# Altium footprint library 显示器件.PcbLib: 14 footprints
Each footprint in its own frame and in the unit in brackets; x right, y up, seen from the top. Pads: shape width x height; smd on the part's side, far side on the other; paste and mask are expansions set on the pad; w line width, h text height; cw(c..) or ccw(c..) is an arc to the next point about the centre after c.
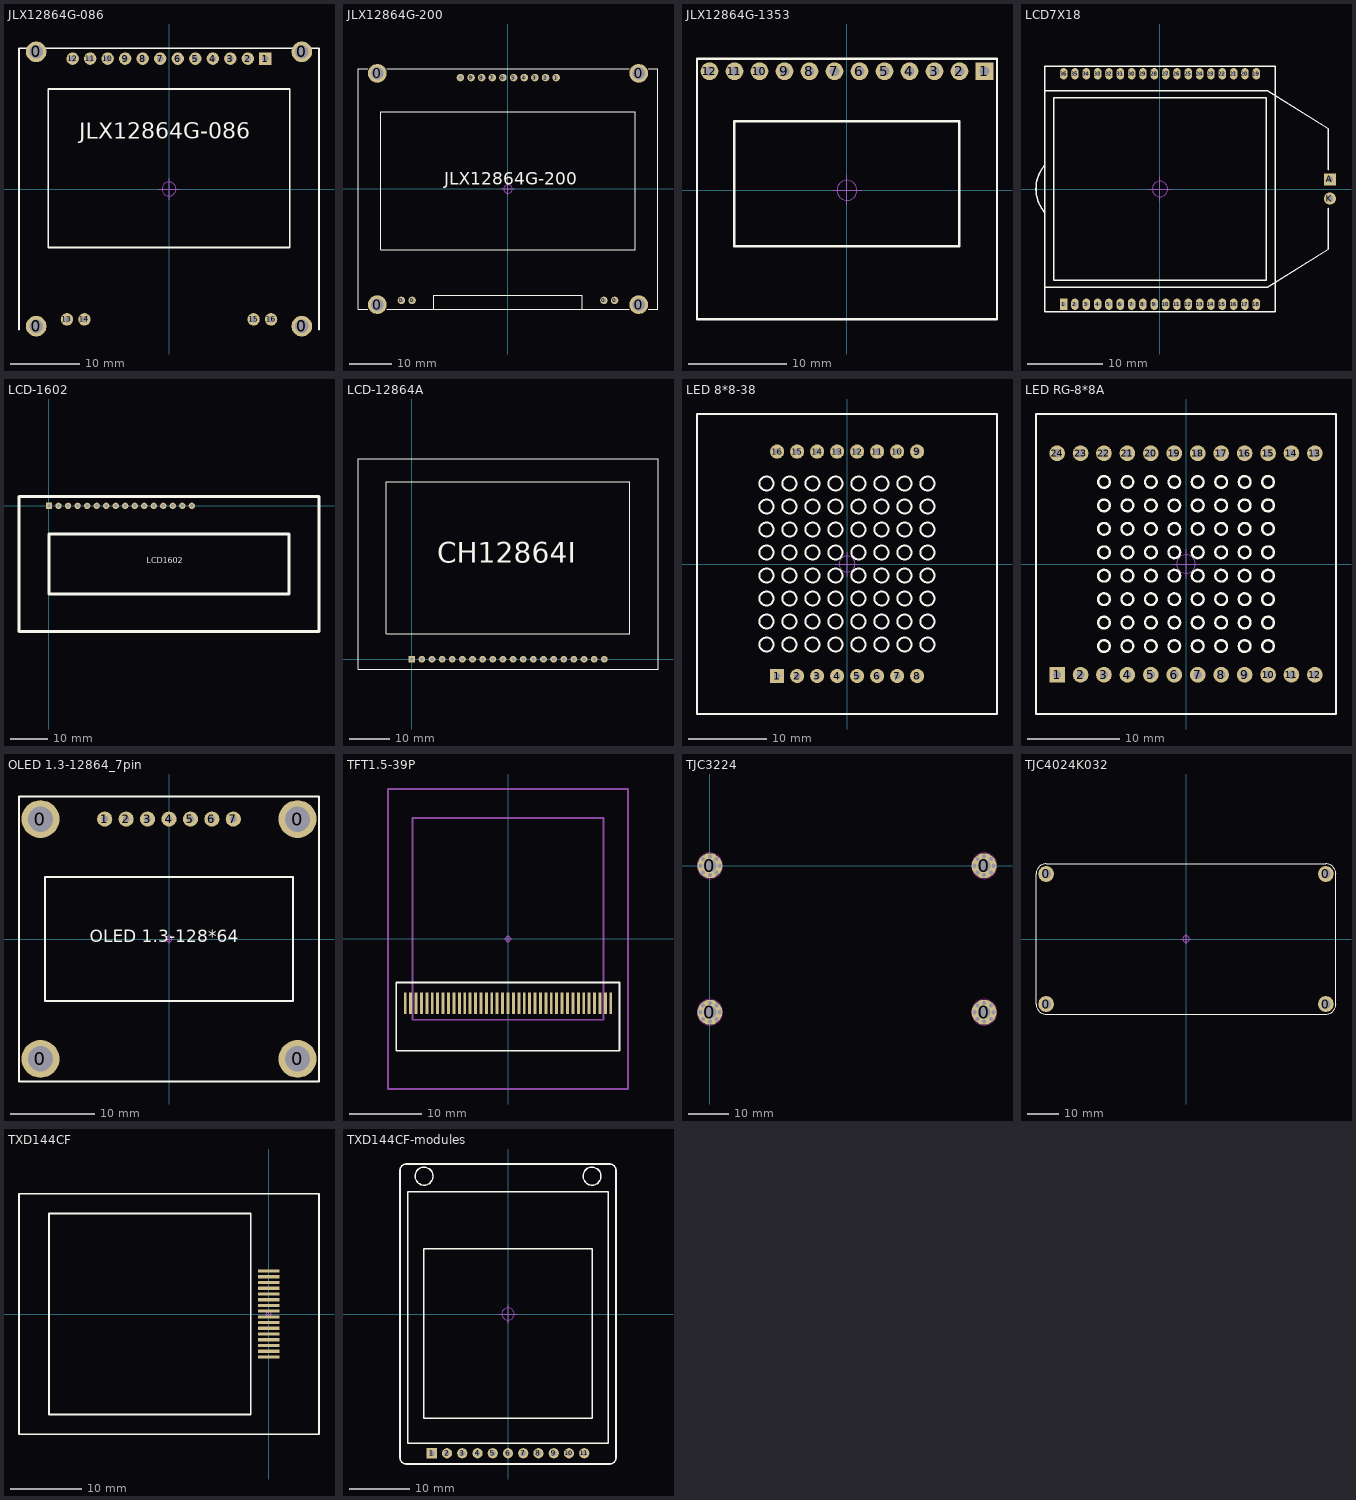
[diagram p0: the footprints below, top view; thin cyan lines are the x and y axes]

## JLX12864G-086 [mm] "长：43.5mm，宽：40.8mm，高：4.5mm"
pads (20):
  round 3 hole 2: 0(-19.25,-19.9) 0(-19.25,19.9) 0(19.25,-19.9) 0(19.25,19.9)
  rect 1.8x1.8 hole 0.9: 1(13.97,18.9)
  round 1.8 hole 0.9: 2(11.43,18.9) 3(8.89,18.9) 4(6.35,18.9) 5(3.81,18.9) 6(1.27,18.9) 7(-1.27,18.9) 8(-3.81,18.9) 9(-6.35,18.9) 10(-8.89,18.9) 11(-11.43,18.9) 12(-13.97,18.9) 13(-14.8,-18.9) 14(-12.26,-18.9) 15(12.26,-18.9) 16(14.8,-18.9)
Top Overlay:
  lines w0.254: -21.75,-20.4 -21.75,20.4 21.75,20.4 21.75,-20.4 ; -17.5,-8.5 17.5,-8.5 17.5,14.5 -17.5,14.5 -17.5,-8.5
  text "JLX12864G-086" at -13,6.5 h4
Mechanical 15:
  circle w0.1: c0,0 r1.016
  lines w0.1: -1.524,0 1.524,0 ; 0,-1.524 0,1.524
3D body: height 7.09, standoff -5.88, extent -21.75,-20.401 21.75,20.401

## JLX12864G-200 [mm] "长：71.4mm，宽：57.2mm，高：9.4mm"
pads (18):
  round 4.5 hole 3: 0(-31.2,-27.6) 0(-31.2,27.6) 0(31.2,-27.6) 0(31.2,27.6)
  round 1.8 hole 0.9: 0(-25.44,-26.6) 0(-22.9,-26.6) 0(22.9,-26.6) 0(25.44,-26.6) 1(11.5,26.6) 2(8.96,26.6) 3(6.42,26.6) 4(3.88,26.6) 5(1.34,26.6) 6(-1.2,26.6) 7(-3.74,26.6) 8(-6.28,26.6) 9(-8.82,26.6) 10(-11.36,26.6)
Top Overlay:
  lines w0.2: -33.528,-28.702 -35.814,-28.702 -35.814,28.702 -33.528,28.702 ; -28.956,-28.702 28.956,-28.702 ; -28.956,28.702 28.956,28.702 ; -17.78,-28.702 -17.78,-25.4 17.78,-25.4 17.78,-28.702 ; 33.528,-28.702 35.814,-28.702 35.814,28.702 33.528,28.702 ; -30.39,-14.53 30.39,-14.53 30.39,18.43 -30.39,18.43 -30.39,-14.53
  text "JLX12864G-200" at -15.24,0 h5.08
Mechanical 15:
  circle w0.1: c0,0 r1.016
  lines w0.1: -1.524,0 1.524,0 ; 0,-1.524 0,1.524
3D body: height 9.4, standoff -6.02, extent -35.7,-28.6 35.7,28.6

## JLX12864G-1353 [mm] "29.9mm*26.17mm"
pads (12):
  rect 1.8x1.8 hole 1: 1(13.97,12.1)
  round 1.8 hole 1: 2(11.43,12.1) 3(8.89,12.1) 4(6.35,12.1) 5(3.81,12.1) 6(1.27,12.1) 7(-1.27,12.1) 8(-3.81,12.1) 9(-6.35,12.1) 10(-8.89,12.1) 11(-11.43,12.1) 12(-13.97,12.1)
Top Overlay:
  lines w0.254: -15.24,-13.1 15.24,-13.1 15.24,13.37 ; -15.24,-13.1 -15.24,-13.1 ; -15.24,-13.1 -15.24,13.37 15.24,13.37 ; 15.24,13.37 15.24,13.37 ; -11.43,-5.68 -11.43,7.02 11.43,7.02 11.43,-5.68 -11.43,-5.68
Mechanical 15:
  circle w0.1: c0,0 r1.016
  lines w0.1: -1.524,0 1.524,0 ; 0,-1.524 0,1.524
3D body: height 7.1, standoff -5.97, extent -15.24,-13.1 15.24,13.37

## LCD7X18 [mm] "定制型带背光液晶屏"
pads (38):
  rect 1x1.5 hole 0.6: 1(-12.75,-15.25)
  oval 1x1.5 hole 0.6: 2(-11.25,-15.25) 3(-9.75,-15.25) 4(-8.25,-15.25) 5(-6.75,-15.25) 6(-5.25,-15.25) 7(-3.75,-15.25) 8(-2.25,-15.25) 9(-0.75,-15.25) 10(0.75,-15.25) 11(2.25,-15.25) 12(3.75,-15.25) 13(5.25,-15.25) 14(6.75,-15.25) 15(8.25,-15.25) 16(9.75,-15.25) 17(11.25,-15.25) 18(12.75,-15.25) 19(12.75,15.25) 20(11.25,15.25) 21(9.75,15.25) 22(8.25,15.25) 23(6.75,15.25) 24(5.25,15.25) 25(3.75,15.25) 26(2.25,15.25) 27(0.75,15.25) 28(-0.75,15.25) 29(-2.25,15.25) 30(-3.75,15.25) 31(-5.25,15.25) 32(-6.75,15.25) 33(-8.25,15.25) 34(-9.75,15.25) 35(-11.25,15.25) 36(-12.75,15.25)
  rect 1.6x1.6 hole 0.8: A(22.5,1.27)
  round 1.6 hole 0.8: K(22.5,-1.27)
Top Overlay:
  lines w0.203: -15.25,-13 14.25,-13 22.25,-8 22.25,-2.54 ; -15.25,13 14.25,13 22.25,8 22.25,2.54 ; -15.25,3.137 ccw(c-11.574,0) -15.231,-3.159 ; -15.25,-16.25 -15.25,16.25 15.25,16.25 15.25,-16.25 -15.25,-16.25 ; -14.05,-12.05 -14.05,12.05 14.05,12.05 14.05,-12.05 -14.05,-12.05
Mechanical 15:
  circle w0.1: c0,0 r1.016
  lines w0.1: -1.524,0 1.524,0 ; 0,-1.524 0,1.524

## LCD-1602 [mm] "LCD module 16*2 char"
pads (16):
  rect 1.7x1.7 hole 0.9: 1(0,0)
  round 1.7 hole 0.9: 2(2.54,0) 3(5.08,0) 4(7.62,0) 5(10.16,0) 6(12.7,0) 7(15.24,0) 8(17.78,0) 9(20.32,0) 10(22.86,0) 11(25.4,0) 12(27.94,0) 13(30.48,0) 14(33.02,0) 15(35.56,0) 16(38.1,0)
Top Overlay:
  lines w0.762: -8,-33.5 72,-33.5 72,2.5 -8,2.5 -8,-33.5 ; 0,-23.5 64,-23.5 64,-7.5 0,-7.5 0,-23.5
  text "LCD1602" at 26.036,-15.28 h1.52
3D body: height 9, standoff -3.7, extent -8.147,-33.11 71.853,1.89

## LCD-12864A [mm] "CH12864I 显示屏，规格：75*52.7mm"
pads (20):
  rect 1.7x1.7 hole 0.9: 1(0,0)
  round 1.7 hole 0.9: 2(2.54,0) 3(5.08,0) 4(7.62,0) 5(10.16,0) 6(12.7,0) 7(15.24,0) 8(17.78,0) 9(20.32,0) 10(22.86,0) 11(25.4,0) 12(27.94,0) 13(30.48,0) 14(33.02,0) 15(35.56,0) 16(38.1,0) 17(40.64,0) 18(43.18,0) 19(45.72,0) 20(48.26,0)
Top Overlay:
  lines w0.254: -13.462,-2.54 61.722,-2.54 61.722,50.292 -13.462,50.292 -13.462,-2.54 ; -6.35,6.35 54.61,6.35 54.61,44.45 -6.35,44.45 -6.35,6.35
  text "CH12864I" at 6.35,24.13 h5.08
3D body: height 8.54, standoff -3, extent -1.27,-1.27 49.53,1.27
3D body: height 7.93, standoff -0.57, extent -13.345,-2.489 61.655,50.211

## LED 8*8-38 [mm] "单色8*8点阵，38mm*38mm"
pads (16):
  rect 1.8x1.8 hole 0.8: 1(-8.874,-14.224)
  round 1.8 hole 0.8: 2(-6.334,-14.224) 3(-3.794,-14.224) 4(-1.254,-14.224) 5(1.286,-14.224) 6(3.826,-14.224) 7(6.366,-14.224) 8(8.906,-14.224) 9(8.906,14.276) 10(6.366,14.276) 11(3.826,14.276) 12(1.286,14.276) 13(-1.254,14.276) 14(-3.794,14.276) 15(-6.334,14.276) 16(-8.874,14.276)
Top Overlay:
  circle w0.254: c1.46,1.46 r0.889
  circle w0.254: c-1.46,1.46 r0.889
  circle w0.254: c-1.46,-1.46 r0.889
  circle w0.254: c1.46,-1.46 r0.889
  circle w0.254: c1.46,4.381 r0.889
  circle w0.254: c1.46,7.302 r0.889
  circle w0.254: c1.46,10.223 r0.889
  circle w0.254: c1.46,-4.381 r0.889
  circle w0.254: c1.46,-7.302 r0.889
  circle w0.254: c1.46,-10.223 r0.889
  circle w0.254: c4.381,-1.46 r0.889
  circle w0.254: c7.302,-1.46 r0.889
  circle w0.254: c10.223,-1.46 r0.889
  circle w0.254: c-4.381,-1.46 r0.889
  circle w0.254: c-7.302,-1.46 r0.889
  circle w0.254: c-10.223,-1.46 r0.889
  circle w0.254: c-10.223,10.223 r0.889
  circle w0.254: c-7.302,10.223 r0.889
  circle w0.254: c-4.381,10.223 r0.889
  circle w0.254: c-1.46,10.223 r0.889
  circle w0.254: c-1.46,7.302 r0.889
  circle w0.254: c-4.381,7.302 r0.889
  circle w0.254: c-7.302,7.302 r0.889
  circle w0.254: c-10.223,7.302 r0.889
  circle w0.254: c-10.223,4.381 r0.889
  circle w0.254: c-7.302,4.381 r0.889
  circle w0.254: c-4.381,4.381 r0.889
  circle w0.254: c-1.46,4.381 r0.889
  circle w0.254: c-4.381,1.46 r0.889
  circle w0.254: c-7.302,1.46 r0.889
  circle w0.254: c-10.223,1.46 r0.889
  circle w0.254: c-10.223,-4.381 r0.889
  circle w0.254: c-10.223,-7.302 r0.889
  circle w0.254: c-10.223,-10.223 r0.889
  circle w0.254: c-7.302,-10.223 r0.889
  circle w0.254: c-7.302,-7.302 r0.889
  circle w0.254: c-7.302,-4.381 r0.889
  circle w0.254: c-4.381,-4.381 r0.889
  circle w0.254: c-4.381,-7.302 r0.889
  circle w0.254: c-4.381,-10.223 r0.889
  circle w0.254: c-1.46,-10.223 r0.889
  circle w0.254: c-1.46,-7.302 r0.889
  circle w0.254: c-1.46,-4.381 r0.889
  circle w0.254: c4.381,10.223 r0.889
  circle w0.254: c7.302,10.223 r0.889
  circle w0.254: c10.223,10.223 r0.889
  circle w0.254: c10.223,1.46 r0.889
  circle w0.254: c10.223,4.381 r0.889
  circle w0.254: c10.223,7.302 r0.889
  circle w0.254: c7.302,7.302 r0.889
  circle w0.254: c7.302,4.381 r0.889
  circle w0.254: c7.302,1.46 r0.889
  circle w0.254: c4.381,1.46 r0.889
  circle w0.254: c4.381,4.381 r0.889
  circle w0.254: c4.381,7.302 r0.889
  circle w0.254: c4.381,-4.381 r0.889
  circle w0.254: c4.381,-7.302 r0.889
  circle w0.254: c4.381,-10.223 r0.889
  circle w0.254: c7.302,-10.223 r0.889
  circle w0.254: c7.302,-7.302 r0.889
  circle w0.254: c7.302,-4.381 r0.889
  circle w0.254: c10.223,-4.381 r0.889
  circle w0.254: c10.223,-7.302 r0.889
  circle w0.254: c10.223,-10.223 r0.889
  lines w0.254: -19.05,-19.05 -19.05,19.05 19.05,19.05 19.05,-19.05 -19.05,-19.05
Mechanical 15:
  circle w0.1: c0,0 r1.016
  lines w0.1: -1.524,0 1.524,0 ; 0,-1.524 0,1.524
3D body: height 7.25, standoff -3.45, extent -19,-19 19,19

## LED RG-8*8A [mm] "双色8*8点阵,32*32mm"
pads (24):
  rect 1.7x1.7 hole 0.9: 1(-13.97,-12)
  round 1.7 hole 0.9: 2(-11.43,-12) 3(-8.89,-12) 4(-6.35,-12) 5(-3.81,-12) 6(-1.27,-12) 7(1.27,-12) 8(3.81,-12) 9(6.35,-12) 10(8.89,-12) 11(11.43,-12) 12(13.97,-12) 13(13.97,12) 14(11.43,12) 15(8.89,12) 16(6.35,12) 17(3.81,12) 18(1.27,12) 19(-1.27,12) 20(-3.81,12) 21(-6.35,12) 22(-8.89,12) 23(-11.43,12) 24(-13.97,12)
Top Overlay:
  circle w0.254: c8.89,-8.89 r0.635
  circle w0.254: c8.89,-6.35 r0.635
  circle w0.254: c8.89,-3.81 r0.635
  circle w0.254: c6.35,-3.81 r0.635
  circle w0.254: c6.35,-6.35 r0.635
  circle w0.254: c6.35,-8.89 r0.635
  circle w0.254: c3.81,-8.89 r0.635
  circle w0.254: c3.81,-6.35 r0.635
  circle w0.254: c3.81,-3.81 r0.635
  circle w0.254: c3.81,6.35 r0.635
  circle w0.254: c3.81,3.81 r0.635
  circle w0.254: c3.81,1.27 r0.635
  circle w0.254: c6.35,1.27 r0.635
  circle w0.254: c6.35,3.81 r0.635
  circle w0.254: c6.35,6.35 r0.635
  circle w0.254: c8.89,6.35 r0.635
  circle w0.254: c8.89,3.81 r0.635
  circle w0.254: c8.89,1.27 r0.635
  circle w0.254: c8.89,8.89 r0.635
  circle w0.254: c6.35,8.89 r0.635
  circle w0.254: c3.81,8.89 r0.635
  circle w0.254: c-1.27,-3.81 r0.635
  circle w0.254: c-1.27,-6.35 r0.635
  circle w0.254: c-1.27,-8.89 r0.635
  circle w0.254: c-3.81,-8.89 r0.635
  circle w0.254: c-3.81,-6.35 r0.635
  circle w0.254: c-3.81,-3.81 r0.635
  circle w0.254: c-6.35,-3.81 r0.635
  circle w0.254: c-6.35,-6.35 r0.635
  circle w0.254: c-6.35,-8.89 r0.635
  circle w0.254: c-8.89,-8.89 r0.635
  circle w0.254: c-8.89,-6.35 r0.635
  circle w0.254: c-8.89,-3.81 r0.635
  circle w0.254: c-8.89,1.27 r0.635
  circle w0.254: c-6.35,1.27 r0.635
  circle w0.254: c-3.81,1.27 r0.635
  circle w0.254: c-1.27,3.81 r0.635
  circle w0.254: c-3.81,3.81 r0.635
  circle w0.254: c-6.35,3.81 r0.635
  circle w0.254: c-8.89,3.81 r0.635
  circle w0.254: c-8.89,6.35 r0.635
  circle w0.254: c-6.35,6.35 r0.635
  circle w0.254: c-3.81,6.35 r0.635
  circle w0.254: c-1.27,6.35 r0.635
  circle w0.254: c-1.27,8.89 r0.635
  circle w0.254: c-3.81,8.89 r0.635
  circle w0.254: c-6.35,8.89 r0.635
  circle w0.254: c-8.89,8.89 r0.635
  circle w0.254: c-8.89,-1.27 r0.635
  circle w0.254: c-6.35,-1.27 r0.635
  circle w0.254: c-3.81,-1.27 r0.635
  circle w0.254: c8.89,-1.27 r0.635
  circle w0.254: c6.35,-1.27 r0.635
  circle w0.254: c3.81,-1.27 r0.635
  circle w0.254: c1.27,-8.89 r0.635
  circle w0.254: c1.27,-6.35 r0.635
  circle w0.254: c1.27,-3.81 r0.635
  circle w0.254: c1.27,8.89 r0.635
  circle w0.254: c1.27,6.35 r0.635
  circle w0.254: c1.27,3.81 r0.635
  circle w0.254: c1.27,-1.27 r0.635
  circle w0.254: c-1.27,-1.27 r0.635
  circle w0.254: c-1.27,1.27 r0.635
  circle w0.254: c1.27,1.27 r0.635
  lines w0.254: -16.256,-16.256 -16.256,16.256 16.256,16.256 16.256,-16.256 -16.256,-16.256
Mechanical 15:
  circle w0.1: c0,0 r1.016
  lines w0.1: -1.524,0 1.524,0 ; 0,-1.524 0,1.524
3D body: height 8, standoff -6, extent -16,-16 16,16

## OLED 1.3-12864_7pin [mm] "长：35.4mm，宽：33.5mm，"
pads (11):
  round 4.5 hole 3: 0(-15.24,-14.21) 0(-15.24,14.21) 0(15.24,-14.21) 0(15.24,14.21)
  round 1.8 hole 0.8: 1(-7.62,14.21) 2(-5.08,14.21) 3(-2.54,14.21) 4(0,14.21) 5(2.54,14.21) 6(5.08,14.21) 7(7.62,14.21)
Top Overlay:
  lines w0.2: -17.78,-16.891 17.78,-16.891 17.78,16.891 -17.78,16.891 -17.78,-16.891 ; -14.7,-7.35 -14.7,7.35 14.7,7.35 14.7,-7.35 -14.7,-7.35
  text "OLED 1.3-128*64" at -9.398,-0.889 h2.54
Mechanical 15:
  circle w0.05: c0,0 r0.35
  lines w0.05: -0.5,0 0.5,0 ; 0,-0.5 0,0.5
3D body: height 5.5, standoff -6.02, extent -17.7,-16.75 17.7,16.75

## TFT1.5-39P [mm] "长41.6mm，宽33.4mm，厚2.7mm，脚距0.75mm"
pads (39):
  rect 0.4x3 smd: 1(-14.25,-8.89) 2(-13.5,-8.89) 3(-12.75,-8.89) 4(-12,-8.89) 5(-11.25,-8.89) 6(-10.5,-8.89) 7(-9.75,-8.89) 8(-9,-8.89) 9(-8.25,-8.89) 10(-7.5,-8.89) 11(-6.75,-8.89) 12(-6,-8.89) 13(-5.25,-8.89) 14(-4.5,-8.89) 15(-3.75,-8.89) 16(-3,-8.89) 17(-2.25,-8.89) 18(-1.5,-8.89) 19(-0.75,-8.89) 20(0,-8.89) 21(0.75,-8.89) 22(1.5,-8.89) 23(2.25,-8.89) 24(3,-8.89) 25(3.75,-8.89) 26(4.5,-8.89) 27(5.25,-8.89) 28(6,-8.89) 29(6.75,-8.89) 30(7.5,-8.89) 31(8.25,-8.89) 32(9,-8.89) 33(9.75,-8.89) 34(10.5,-8.89) 35(11.25,-8.89) 36(12,-8.89) 37(12.75,-8.89) 38(13.5,-8.89) 39(14.25,-8.89)
Top Overlay:
  lines w0.254: -15.495,-15.5 15.468,-15.5 15.468,-6.05 -15.495,-6.05 -15.495,-15.5
Mechanical 15:
  circle w0.05: c0,0 r0.35
  lines w0.05: -0.5,0 0.5,0 ; 0,-0.5 0,0.5
  lines w0.254: -16.65,-20.8 16.65,-20.8 16.65,20.8 -16.65,20.8 -16.65,-20.8 ; -13.25,-11.2 -13.25,7.7 -13.25,16.8 13.25,16.8 13.25,-11.2 -13.25,-11.2
3D body: height 6.65, standoff 0, extent -16.65,-20.884 16.65,20.85

## TJC3224 [mm]
pads (36):
  round 1 hole 1: 0(-2.35,-36.49) 0(-2.35,0) 0(-1.662,-38.152) 0(-1.662,-34.828) 0(-1.662,-1.662) 0(-1.662,1.662) 0(0,-38.84) 0(0,-34.14) 0(0,-2.35) 0(0,2.35) 0(1.662,-38.152) 0(1.662,-34.828) 0(1.662,-1.662) 0(1.662,1.662) 0(2.35,-36.49) 0(2.35,0) 0(65.97,-36.49) 0(65.97,0) 0(66.658,-38.152) 0(66.658,-34.828) 0(66.658,-1.662) 0(66.658,1.662) 0(68.32,-38.84) 0(68.32,-34.14) 0(68.32,-2.35) 0(68.32,2.35) 0(69.982,-38.152) 0(69.982,-34.828) 0(69.982,-1.662) 0(69.982,1.662) 0(70.67,-36.49) 0(70.67,0)
  round 6.2 hole 3.2: 0(0,-36.49) 0(0,0) 0(68.32,-36.49) 0(68.32,0)
Keep-Out Layer:
  circle w0.254: c0,-36.49 r3.2
  circle w0.254: c68.32,-36.49 r3.2
  circle w0.254: c68.32,0 r3.2
  circle w0.254: c0,0 r3.2
Mechanical 15:
  circle w0.05: c0,0 r0.35
  lines w0.05: -0.5,0 0.5,0 ; 0,-0.5 0,0.5
3D body: height 15.8, standoff 0, extent -3.023,-39.573 71.377,3.147

## TJC4024K032 [mm] "增强型串口显示模块"
pads (4):
  round 5 hole 3: 0(-44.3,-20.6) 0(-44.3,20.6) 0(44.3,-20.6) 0(44.3,20.6)
Top Overlay:
  lines w0.254: -47.5,-20.6 ccw(c-44.3,-20.6) -44.3,-23.8 44.3,-23.8 ccw(c44.3,-20.6) 47.5,-20.6 47.5,20.6 ccw(c44.3,20.6) 44.3,23.8 -44.3,23.8 ccw(c-44.3,20.6) -47.5,20.6 -47.5,-20.6
Mechanical 15:
  circle w0.1: c0,0 r1.016
  lines w0.1: -1.524,0 1.524,0 ; 0,-1.524 0,1.524

## TXD144CF [mm] "16Pin, 1.44寸，128*128"
pads (16):
  rect 3x0.45 smd: 1(0,6) 2(0,5.2) 3(0,4.4) 4(0,3.6) 5(0,2.8) 6(0,2) 7(0,1.2) 8(0,0.4) 9(0,-0.4) 10(0,-1.2) 11(0,-2) 12(0,-2.8) 13(0,-3.6) 14(0,-4.4) 15(0,-5.2) 16(0,-6)
Top Overlay:
  lines w0.254: -34.917,-16.8 -34.917,16.8 7.023,16.8 7.023,-16.8 -34.917,-16.8 ; -30.717,-14.05 -2.517,-14.05 -2.517,14.05 -30.717,14.05 -30.717,-14.05
Mechanical 15:
  circle w0.05: c0,0 r0.35
  lines w0.05: -0.5,0 0.5,0 ; 0,-0.5 0,0.5
3D body: height 2.8, standoff 0.05, extent -34.917,-16.675 7.023,16.675

## TXD144CF-modules [mm] "1.44寸TFT模块"
pads (11):
  rect 1.7x1.7 hole 0.9: 1(-12.7,-23.214)
  round 1.7 hole 0.9: 2(-10.16,-23.214) 3(-7.62,-23.214) 4(-5.08,-23.214) 5(-2.54,-23.214) 6(0,-23.214) 7(2.54,-23.214) 8(5.08,-23.214) 9(7.62,-23.214) 10(10.16,-23.214) 11(12.7,-23.214)
Top Overlay:
  circle w0.25: c-14,22.968 r1.5
  circle w0.25: c14,22.968 r1.5
  lines w0.254: -18,-24 ccw(c-17,-24) -17,-25 17,-25 ccw(c17,-24) 18,-24 18,24 ccw(c17,24) 17,25 -17,25 ccw(c-17,24) -18,24 -18,-24 ; -16.675,-21.546 -16.675,20.394 16.675,20.394 16.675,-21.546 -16.675,-21.546 ; -14.05,-17.346 -14.05,10.854 14.05,10.854 14.05,-17.346 -14.05,-17.346
Mechanical 15:
  circle w0.1: c0,0 r1.016
  lines w0.1: -1.524,0 1.524,0 ; 0,-1.524 0,1.524
3D body: height 6.65, standoff -5.98, extent -18,-25 18,25